# Altium footprint library CubeSat-Backplane.PcbLib: 54 footprints (part 3 of 4)
Each footprint in its own frame and in the unit in brackets; x right, y up, seen from the top. Pads: shape width x height; smd on the part's side, far side on the other; paste and mask are expansions set on the pad; w line width, h text height; cw(c..) or ccw(c..) is an arc to the next point about the centre after c.
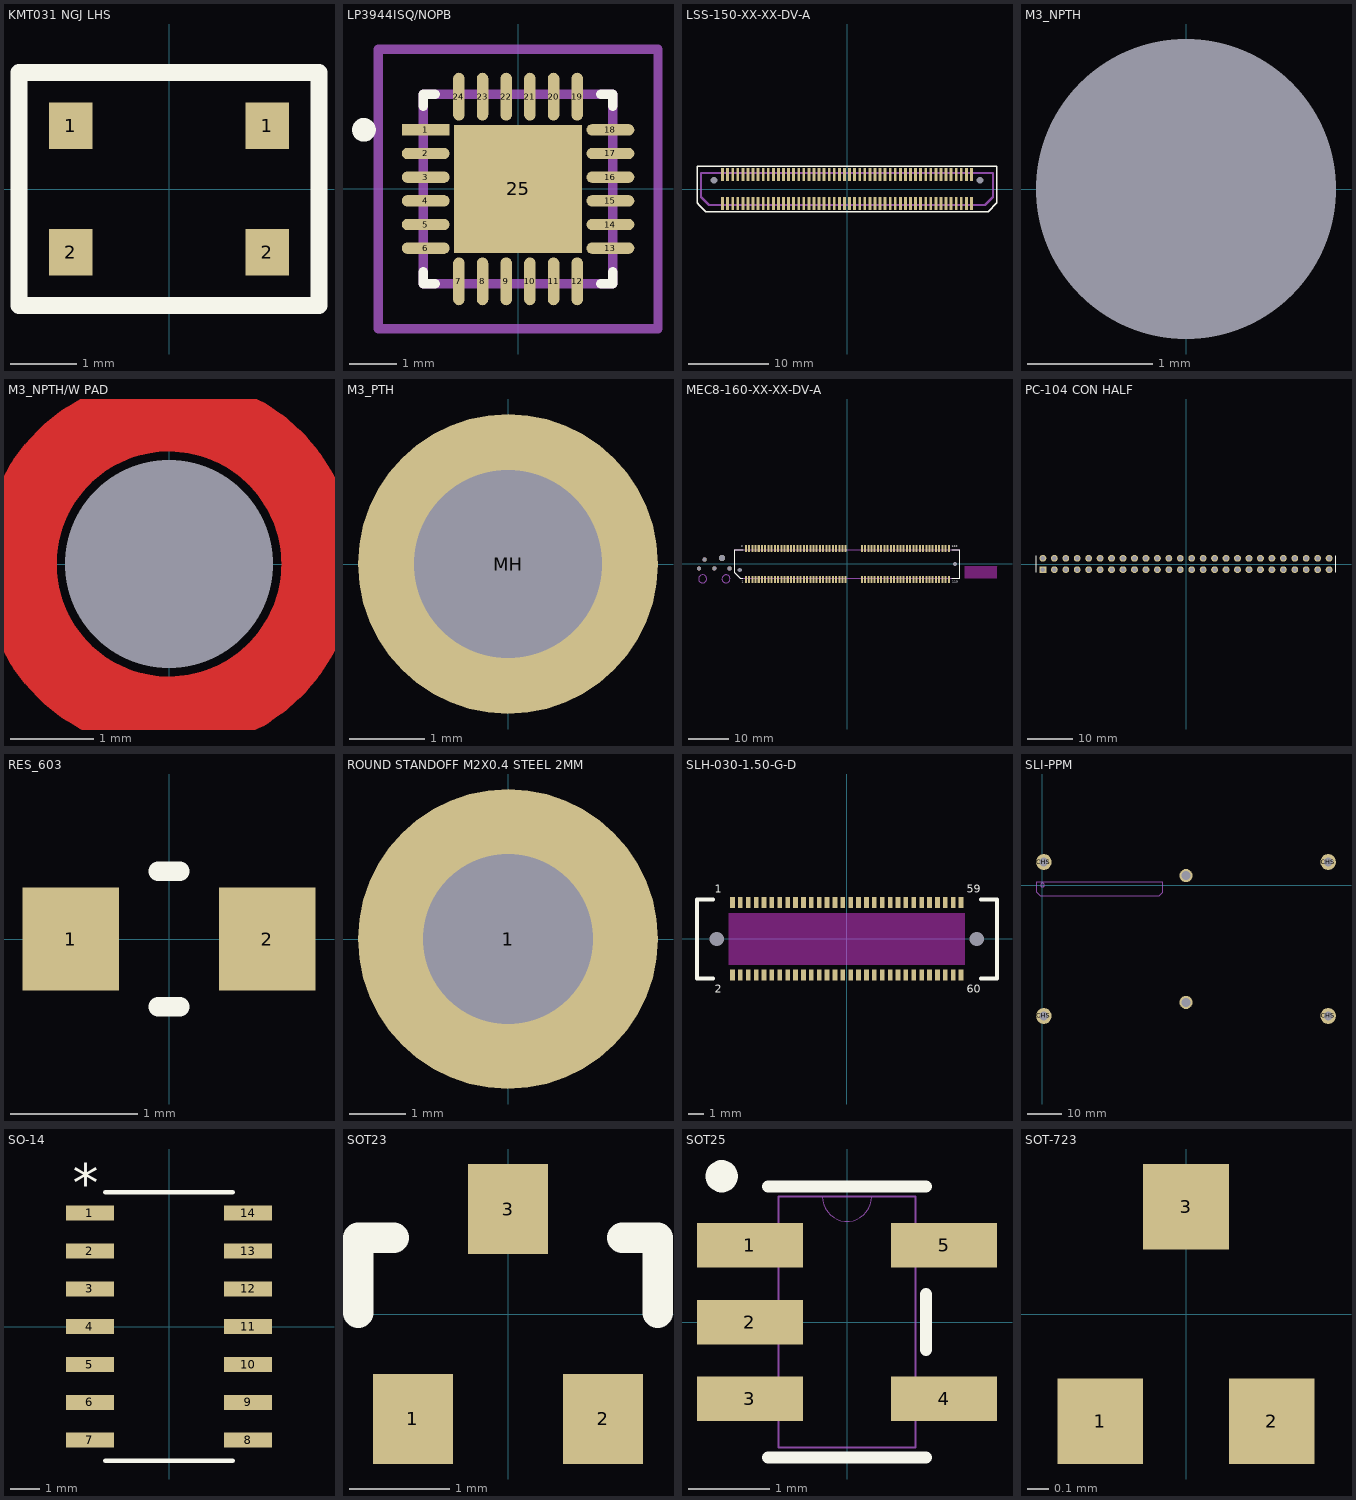
[diagram p2: the footprints below, top view; thin cyan lines are the x and y axes]

## KMT031 NGJ LHS [mm] "SWITCH TACTILE SPST-NO 0.05A 32V"
height 0.65
pads (4):
  rect 0.65x0.7 smd: 1(-1.475,0.95) 1(1.475,0.95) 2(-1.475,-0.95) 2(1.475,-0.95)
Top Overlay:
  lines w0.254: -2.25,-1.75 -2.25,1.75 2.25,1.75 2.25,-1.75 -2.25,-1.75
3D body "KMT031NGJLHS.stp": height 0.69, standoff 0.01, extent -1.698,-1.3 1.698,1.3

## LP3944ISQ/NOPB [mm] "24WQFN"
pads (25):
  rect 1.01x0.242 smd paste+0 mask+0: 1(-1.951,1.25)
  rrect100% 1.01x0.242 smd paste+0 mask+0: 2(-1.951,0.75) 3(-1.951,0.25) 4(-1.951,-0.25) 5(-1.951,-0.75) 6(-1.951,-1.25) 13(1.951,-1.25) 14(1.951,-0.75) 15(1.951,-0.25) 16(1.951,0.25) 17(1.951,0.75) 18(1.951,1.25)
  rrect100% 0.242x1.01 smd paste+0 mask+0: 7(-1.25,-1.951) 8(-0.75,-1.951) 9(-0.25,-1.951) 10(0.25,-1.951) 11(0.75,-1.951) 12(1.25,-1.951) 19(1.25,1.951) 20(0.75,1.951) 21(0.25,1.951) 22(-0.25,1.951) 23(-0.75,1.951) 24(-1.25,1.951)
  rect 2.7x2.7 smd paste-1000 mask+0: 25(0,0)
Top Overlay:
  circle w0.25: c-3.256,1.25 r0.125
  lines w0.2: -2,-1.75 -2,-2 -1.75,-2 ; -2,1.75 -2,2 -1.75,2 ; 1.75,-2 2,-2 2,-1.75 ; 1.75,2 2,2 2,1.75
Top Paste:
  rectangle: -0.854,-0.854 0.854,0.854
Bottom Assembly:
  lines w0.2: -2.956,-2.956 2.956,-2.956 2.956,2.956 -2.956,2.956 -2.956,-2.956
  text ".Designator" at 0,0.188 h1
BOARD CHAMFER:
  lines w0.2: -2,-2 2,-2 2,2 -2,2 -2,-2
Mechanical 15:
  lines w0.2: -2.956,-2.956 2.956,-2.956 2.956,2.956 -2.956,2.956 -2.956,-2.956
Mechanical 16:
  lines w0.1: -0.5,0 0.5,0 ; 0,-0.5 0,0.5
3D body "IC_Texas_Instruments_LP55231SQX-NOPB_eec.STEP": height 0.25, standoff 0, extent -2.956,-2.956 2.956,2.956

## LSS-150-XX-XX-DV-A [mm] "Samtec 100 pin LSS Series Pins"
height 7.3
pads (102):
  rect 0.356x1.6 smd mask+0.05: 1(15.557,-1.8) 2(15.557,1.8) 3(14.922,-1.8) 4(14.922,1.8) 5(14.287,-1.8) 6(14.287,1.8) 7(13.652,-1.8) 8(13.652,1.8) 9(13.018,-1.8) 10(13.018,1.8) 11(12.383,-1.8) 12(12.383,1.8) 13(11.747,-1.8) 14(11.747,1.8) 15(11.112,-1.8) 16(11.112,1.8) 17(10.477,-1.8) 18(10.477,1.8) 19(9.842,-1.8) 20(9.842,1.8) 21(9.207,-1.8) 22(9.207,1.8) 23(8.572,-1.8) 24(8.572,1.8) 25(7.938,-1.8) 26(7.938,1.8) 27(7.302,-1.8) 28(7.302,1.8) 29(6.667,-1.8) 30(6.667,1.8) 31(6.032,-1.8) 32(6.032,1.8) 33(5.397,-1.8) 34(5.397,1.8) 35(4.763,-1.8) 36(4.763,1.8) 37(4.127,-1.8) 38(4.127,1.8) 39(3.492,-1.8) 40(3.492,1.8) 41(2.857,-1.8) 42(2.857,1.8) 43(2.222,-1.8) 44(2.222,1.8) 45(1.587,-1.8) 46(1.587,1.8) 47(0.953,-1.8) 48(0.953,1.8) 49(0.318,-1.8) 50(0.318,1.8) 51(-0.318,-1.8) 52(-0.318,1.8) 53(-0.953,-1.8) 54(-0.953,1.8) 55(-1.587,-1.8) 56(-1.587,1.8) 57(-2.222,-1.8) 58(-2.222,1.8) 59(-2.857,-1.8) 60(-2.857,1.8) 61(-3.492,-1.8) 62(-3.492,1.8) 63(-4.127,-1.8) 64(-4.127,1.8) 65(-4.763,-1.8) 66(-4.763,1.8) 67(-5.397,-1.8) 68(-5.397,1.8) 69(-6.032,-1.8) 70(-6.032,1.8) 71(-6.667,-1.8) 72(-6.667,1.8) 73(-7.302,-1.8) 74(-7.302,1.8) 75(-7.938,-1.8) 76(-7.938,1.8) 77(-8.572,-1.8) 78(-8.572,1.8) 79(-9.207,-1.8) 80(-9.207,1.8) 81(-9.842,-1.8) 82(-9.842,1.8) 83(-10.477,-1.8) 84(-10.477,1.8) 85(-11.112,-1.8) 86(-11.112,1.8) 87(-11.747,-1.8) 88(-11.747,1.8) 89(-12.383,-1.8) 90(-12.383,1.8) 91(-13.018,-1.8) 92(-13.018,1.8) 93(-13.652,-1.8) 94(-13.652,1.8) 95(-14.287,-1.8) 96(-14.287,1.8) 97(-14.922,-1.8) 98(-14.922,1.8) 99(-15.557,-1.8) 100(-15.557,1.8)
  round 0.2 hole 0.85 unplated mask+0.575: 101(16.625,1.1) 102(-16.625,1.1)
Top Overlay:
  lines w0.178: -18.75,-1.75 -18.475,-2.025 -17.925,-2.575 -17.65,-2.85 17.65,-2.85 18.75,-1.75 18.75,2.85 -18.75,2.85 -18.75,-1.75
Mechanical 1:
  lines w0.254: -18.25,-1 -17.25,-2 17.25,-2 18.25,-1 18.25,2 -18.25,2 -18.25,-1
3D body "LSS-150-02-L-DV-A.stp": height 7.31, standoff -1.03, extent -18.225,-2.3 18.275,2.3

## M3_NPTH [mm] "M3 through-hole"
pads (1):
  round 0 hole 2.4 unplated: MH(0,0)

## M3_NPTH/W PAD [mm] "M3 through-hole"
pads (1):
  round 0 hole 2.5 unplated: MH(0,0)
Top Layer:
  circle w0.9: c0,0 r1.8

## M3_PTH [mm] "M3 plated through-hole for pan head screw"
pads (1):
  round 4 hole 2.5: MH(0,0)

## MEC8-160-XX-XX-DV-A [mm]
pads (127):
  rect 0.5x1.8 smd mask+0.05: 1(-25.2,-3.85) 2(-25.2,3.85) 3(-24.4,-3.85) 4(-24.4,3.85) 5(-23.6,-3.85) 6(-23.6,3.85) 7(-22.8,-3.85) 8(-22.8,3.85) 9(-22,-3.85) 10(-22,3.85) 11(-21.2,-3.85) 12(-21.2,3.85) 13(-20.4,-3.85) 14(-20.4,3.85) 15(-19.6,-3.85) 16(-19.6,3.85) 17(-18.8,-3.85) 18(-18.8,3.85) 19(-18,-3.85) 20(-18,3.85) 21(-17.2,-3.85) 22(-17.2,3.85) 23(-16.4,-3.85) 24(-16.4,3.85) 25(-15.6,-3.85) 26(-15.6,3.85) 27(-14.8,-3.85) 28(-14.8,3.85) 29(-14,-3.85) 30(-14,3.85) 31(-13.2,-3.85) 32(-13.2,3.85) 33(-12.4,-3.85) 34(-12.4,3.85) 35(-11.6,-3.85) 36(-11.6,3.85) 37(-10.8,-3.85) 38(-10.8,3.85) 39(-10,-3.85) 40(-10,3.85) 41(-9.2,-3.85) 42(-9.2,3.85) 43(-8.4,-3.85) 44(-8.4,3.85) 45(-7.6,-3.85) 46(-7.6,3.85) 47(-6.8,-3.85) 48(-6.8,3.85) 49(-6,-3.85) 50(-6,3.85) 51(-5.2,-3.85) 52(-5.2,3.85) 53(-4.4,-3.85) 54(-4.4,3.85) 55(-3.6,-3.85) 56(-3.6,3.85) 57(-2.8,-3.85) 58(-2.8,3.85) 59(-2,-3.85) 60(-2,3.85) 61(-1.2,-3.85) 62(-1.2,3.85) 63(-0.4,-3.85) 64(-0.4,3.85) 65(3.6,-3.85) 66(3.6,3.85) 67(4.4,-3.85) 68(4.4,3.85) 69(5.2,-3.85) 70(5.2,3.85) 71(6,-3.85) 72(6,3.85) 73(6.8,-3.85) 74(6.8,3.85) 75(7.6,-3.85) 76(7.6,3.85) 77(8.4,-3.85) 78(8.4,3.85) 79(9.2,-3.85) 80(9.2,3.85) 81(10,-3.85) 82(10,3.85) 83(10.8,-3.85) 84(10.8,3.85) 85(11.6,-3.85) 86(11.6,3.85) 87(12.4,-3.85) 88(12.4,3.85) 89(13.2,-3.85) 90(13.2,3.85) 91(14,-3.85) 92(14,3.85) 93(14.8,-3.85) 94(14.8,3.85) 95(15.6,-3.85) 96(15.6,3.85) 97(16.4,-3.85) 98(16.4,3.85) 99(17.2,-3.85) 100(17.2,3.85) 101(18,-3.85) 102(18,3.85) 103(18.8,-3.85) 104(18.8,3.85) 105(19.6,-3.85) 106(19.6,3.85) 107(20.4,-3.85) 108(20.4,3.85) 109(21.2,-3.85) 110(21.2,3.85) 111(22,-3.85) 112(22,3.85) 113(22.8,-3.85) 114(22.8,3.85) 115(23.6,-3.85) 116(23.6,3.85) 117(24.4,-3.85) 118(24.4,3.85) 119(25.2,-3.85) 120(25.2,3.85)
  round 0 hole 1.05 unplated: MH1(-26.7,-1.5) MH2(26.7,0)
  round 1 hole 1 unplated: TH(-36.834,-1.1) TH(-35.434,1.1) TH(-33.034,-1.1) TH(-29.234,-1.1)
  round 1.5 hole 1.5 unplated: TH(-31.134,1.494)
Top Overlay:
  lines w0.254: -26,-3.5 -26.6,-3.5 -27.9,-2.2 -27.9,3.5 -25.908,3.5 ; 25.908,-3.5 27.9,-3.5 27.9,3.5 25.908,3.5
  text "119" at 26,-4.6 h0.5
  text "120" at 25.9,4.1 h0.5
  text "2" at -26.3,4.1 h0.5
  text "1" at -26.2,-4.6 h0.5
Keep-Out Layer:
  board cut-out: 37.16,-0.59 37.16,-3.465 37.16,-3.472 37.154,-3.485 37.145,-3.494 37.132,-3.5 37.125,-3.5 29.22,-3.5 29.204,-3.5 29.175,-3.487 29.152,-3.465 29.14,-3.436 29.14,-3.42 29.14,-0.61 29.14,-0.596 29.15,-0.57 29.17,-0.55 29.196,-0.54 29.21,-0.54 37.11,-0.54 37.12,-0.54 37.138,-0.547 37.152,-0.561 37.16,-0.58
Mechanical 1:
  circle w0.1: c-35.934,-3.69 r1
  circle w0.1: c-30.134,-3.69 r1
  lines w0.178: -27.9,-2.2 -26.6,-3.5 27.9,-3.5 27.9,3.5 -27.9,3.5 -27.9,-2.2
3D body "MEC8-160-02-L-DV.stp": height 8.66, standoff 0.01, extent -27.9,-4.4 27.9,4.4

## PC-104 CON HALF [mil] "Standard Cubesat Connector Footprint"
pads (52):
  rect 60x60 hole 40 mask+3: 1(-1250,-50)
  round 60 hole 40 mask+3: 2(-1250,50) 3(-1150,-50) 4(-1150,50) 5(-1050,-50) 6(-1050,50) 7(-950,-50) 8(-950,50) 9(-850,-50) 10(-850,50) 11(-750,-50) 12(-750,50) 13(-650,-50) 14(-650,50) 15(-550,-50) 16(-550,50) 17(-450,-50) 18(-450,50) 19(-350,-50) 20(-350,50) 21(-250,-50) 22(-250,50) 23(-150,-50) 24(-150,50) 25(-50,-50) 26(-50,50) 27(50,-50) 28(50,50) 29(150,-50) 30(150,50) 31(250,-50) 32(250,50) 33(350,-50) 34(350,50) 35(450,-50) 36(450,50) 37(550,-50) 38(550,50) 39(650,-50) 40(650,50) 41(750,-50) 42(750,50) 43(850,-50) 44(850,50) 45(950,-50) 46(950,50) 47(1050,-50) 48(1050,50) 49(1150,-50) 50(1150,50) 51(1250,-50) 52(1250,50)
Top Overlay:
  lines w10: -1310,-70 -1310,70 ; 1310,-70 1310,70

## RES_603 [mil] "0603 Resistor"
height 21.65
pads (2):
  rect 29.78x32 smd paste+0 mask+0: 1(-30.39,0) 2(30.39,0)
Top Overlay:
  lines w6: -3.39,-21 3.39,-21 ; -3.39,21 3.39,21
3D body "User Library-res0603-1.step": height 15.75, standoff 0, extent -31.49,-15.74 31.51,15.75
3D body: height 10, standoff 0, extent 0,0 10,10

## ROUND STANDOFF M2X0.4 STEEL 2MM [mm] "9774020243R"
height 2
pads (1):
  round 5.3 hole 3 unplated: 1(0,0)
3D body "9774020243R_Download_STP_9774020243R_rev1.stp": height 2.01, standoff -1.39, extent -2.175,-2.172 2.175,2.172

## SLH-030-1.50-G-D [mm] "Board to Board & Mezzanine Connectors 0.50 mm Razor Beam LP Ultra Low Profile Socket Strip"
height 1.81
pads (62):
  rect 0.3x0.7 smd mask+0.05: 1(-7.25,2.3) 2(-7.25,-2.3) 3(-6.75,2.3) 4(-6.75,-2.3) 5(-6.25,2.3) 6(-6.25,-2.3) 7(-5.75,2.3) 8(-5.75,-2.3) 9(-5.25,2.3) 10(-5.25,-2.3) 11(-4.75,2.3) 12(-4.75,-2.3) 13(-4.25,2.3) 14(-4.25,-2.3) 15(-3.75,2.3) 16(-3.75,-2.3) 17(-3.25,2.3) 18(-3.25,-2.3) 19(-2.75,2.3) 20(-2.75,-2.3) 21(-2.25,2.3) 22(-2.25,-2.3) 23(-1.75,2.3) 24(-1.75,-2.3) 25(-1.25,2.3) 26(-1.25,-2.3) 27(-0.75,2.3) 28(-0.75,-2.3) 29(-0.25,2.3) 30(-0.25,-2.3) 31(0.25,2.3) 32(0.25,-2.3) 33(0.75,2.3) 34(0.75,-2.3) 35(1.25,2.3) 36(1.25,-2.3) 37(1.75,2.3) 38(1.75,-2.3) 39(2.25,2.3) 40(2.25,-2.3) 41(2.75,2.3) 42(2.75,-2.3) 43(3.25,2.3) 44(3.25,-2.3) 45(3.75,2.3) 46(3.75,-2.3) 47(4.25,2.3) 48(4.25,-2.3) 49(4.75,2.3) 50(4.75,-2.3) 51(5.25,2.3) 52(5.25,-2.3) 53(5.75,2.3) 54(5.75,-2.3) 55(6.25,2.3) 56(6.25,-2.3) 57(6.75,2.3) 58(6.75,-2.3) 59(7.25,2.3) 60(7.25,-2.3)
  round 0 hole 0.9 unplated: TH(-8.25,0) TH(8.25,0)
Top Layer keep-out:
  rectangle: -7.5,-1.651 7.5,1.651
Top Overlay:
  lines w0.254: -8.5,-2.5 -9.5,-2.5 -9.5,2.5 -8.5,2.5 ; 8.53,-2.5 9.53,-2.5 9.53,2.5 8.53,2.5
  text "60" at 7.62,-3.429 h0.5
  text "59" at 7.62,2.921 h0.5
  text "2" at -8.382,-3.429 h0.5
  text "1" at -8.382,2.921 h0.5
3D body "SLH-030-1.50-G-D-A.stp": height 1.84, standoff -0.54, extent -9.53,-2.5 9.53,2.5

## SLI-PPM [mil] "SLI PPM Footprint"
pads (6):
  round 180 hole 100: CHS(16.53,-1496.31) CHS(16.53,263.69) CHS(3266.53,-1496.31) CHS(3266.53,263.69)
  round 150 hole 100: CHS(1641.53,-1341.31) CHS(1641.53,108.69)
Mechanical 1:
  circle w10: c0,0 r21.74
  lines w10: -63.98,-82.68 -24.61,-122.05 1333.66,-122.05 1373.03,-82.68 1373.03,35.43 -63.98,35.43 -63.98,-82.68

## SO-14 [mil]
pads (14):
  rect 63x20 smd paste+0 mask+0: 1(-104.5,150) 2(-104.5,100) 3(-104.5,50) 4(-104.5,0) 5(-104.5,-50) 6(-104.5,-100) 7(-104.5,-150) 8(104.5,-150) 9(104.5,-100) 10(104.5,-50) 11(104.5,0) 12(104.5,50) 13(104.5,100) 14(104.5,150)
Top Overlay:
  lines w6: -84,-177.5 84,-177.5 ; -84,177.5 84,177.5
  text "*" at -127,165 h50
3D body "SO-14.step": height 70.09, standoff 1, extent -122,-172.51 122.01,172.52

## SOT23 [mm]
pads (3):
  rect 0.8x0.9 smd: 1(-0.95,-1.05) 2(0.95,-1.05) 3(0,1.05)
Top Overlay:
  lines w0.305: -1.499,0.013 -1.499,0.762 -1.143,0.762 ; 1.143,0.762 1.499,0.762 1.499,0.013
3D body "SOT23-3.stp": height 1.23, standoff 0.05, extent -1.5,-1.418 1.5,1.418

## SOT25 [mm]
pads (5):
  rect 1.311x0.551 smd paste+0 mask+0: 1(-1.2,0.95) 2(-1.2,0) 3(-1.2,-0.95) 4(1.2,-0.95) 5(1.2,0.95)
Top Overlay:
  circle w0.254: c-1.549,1.803 r0.072
  lines w0.152: -0.977,-1.677 0.977,-1.677 ; -0.977,1.677 0.977,1.677 ; 0.977,-0.342 0.977,0.342
BOARD CHAMFER:
  lines w0: -0.305,1.55 ccw(c0,1.55) 0.305,1.55
  lines w0.025: -1.5,-1.2 -0.85,-1.2 -0.85,-0.7 -1.5,-0.7 -1.5,-1.2 ; -1.5,-0.25 -0.85,-0.25 -0.85,0.25 -1.5,0.25 -1.5,-0.25 ; -1.5,0.7 -0.85,0.7 -0.85,1.2 -1.5,1.2 -1.5,0.7 ; -0.85,-1.55 -0.85,1.55 0.85,1.55 0.85,-1.55 -0.85,-1.55 ; 0.85,-1.2 1.5,-1.2 1.5,-0.7 0.85,-0.7 0.85,-1.2 ; 0.85,0.7 1.5,0.7 1.5,1.2 0.85,1.2 0.85,0.7
3D body "SOT25.stp": height 1.45, standoff 0, extent -1.5,-1.55 1.5,1.55
3D body: height 0.25, standoff 0, extent 0,0 0.254,0.254

## SOT-723 [mm] "1.2 mm × 0.8 mm × 0.55 mm body: three terminals: flat lead"
pads (3):
  rect 0.4x0.4 smd: 1(-0.4,-0.5) 2(0.4,-0.5) 3(0,0.5)
3D body "TRANS_2SC5658T2.step": height 0.61, standoff 0, extent -0.597,-0.648 0.597,0.648